# Altium footprint library PCBKU.PcbLib: 197 footprints (part 12 of 13)
Each footprint in its own frame and in the unit in brackets; x right, y up, seen from the top. Pads: shape width x height; smd on the part's side, far side on the other; paste and mask are expansions set on the pad; w line width, h text height; cw(c..) or ccw(c..) is an arc to the next point about the centre after c.
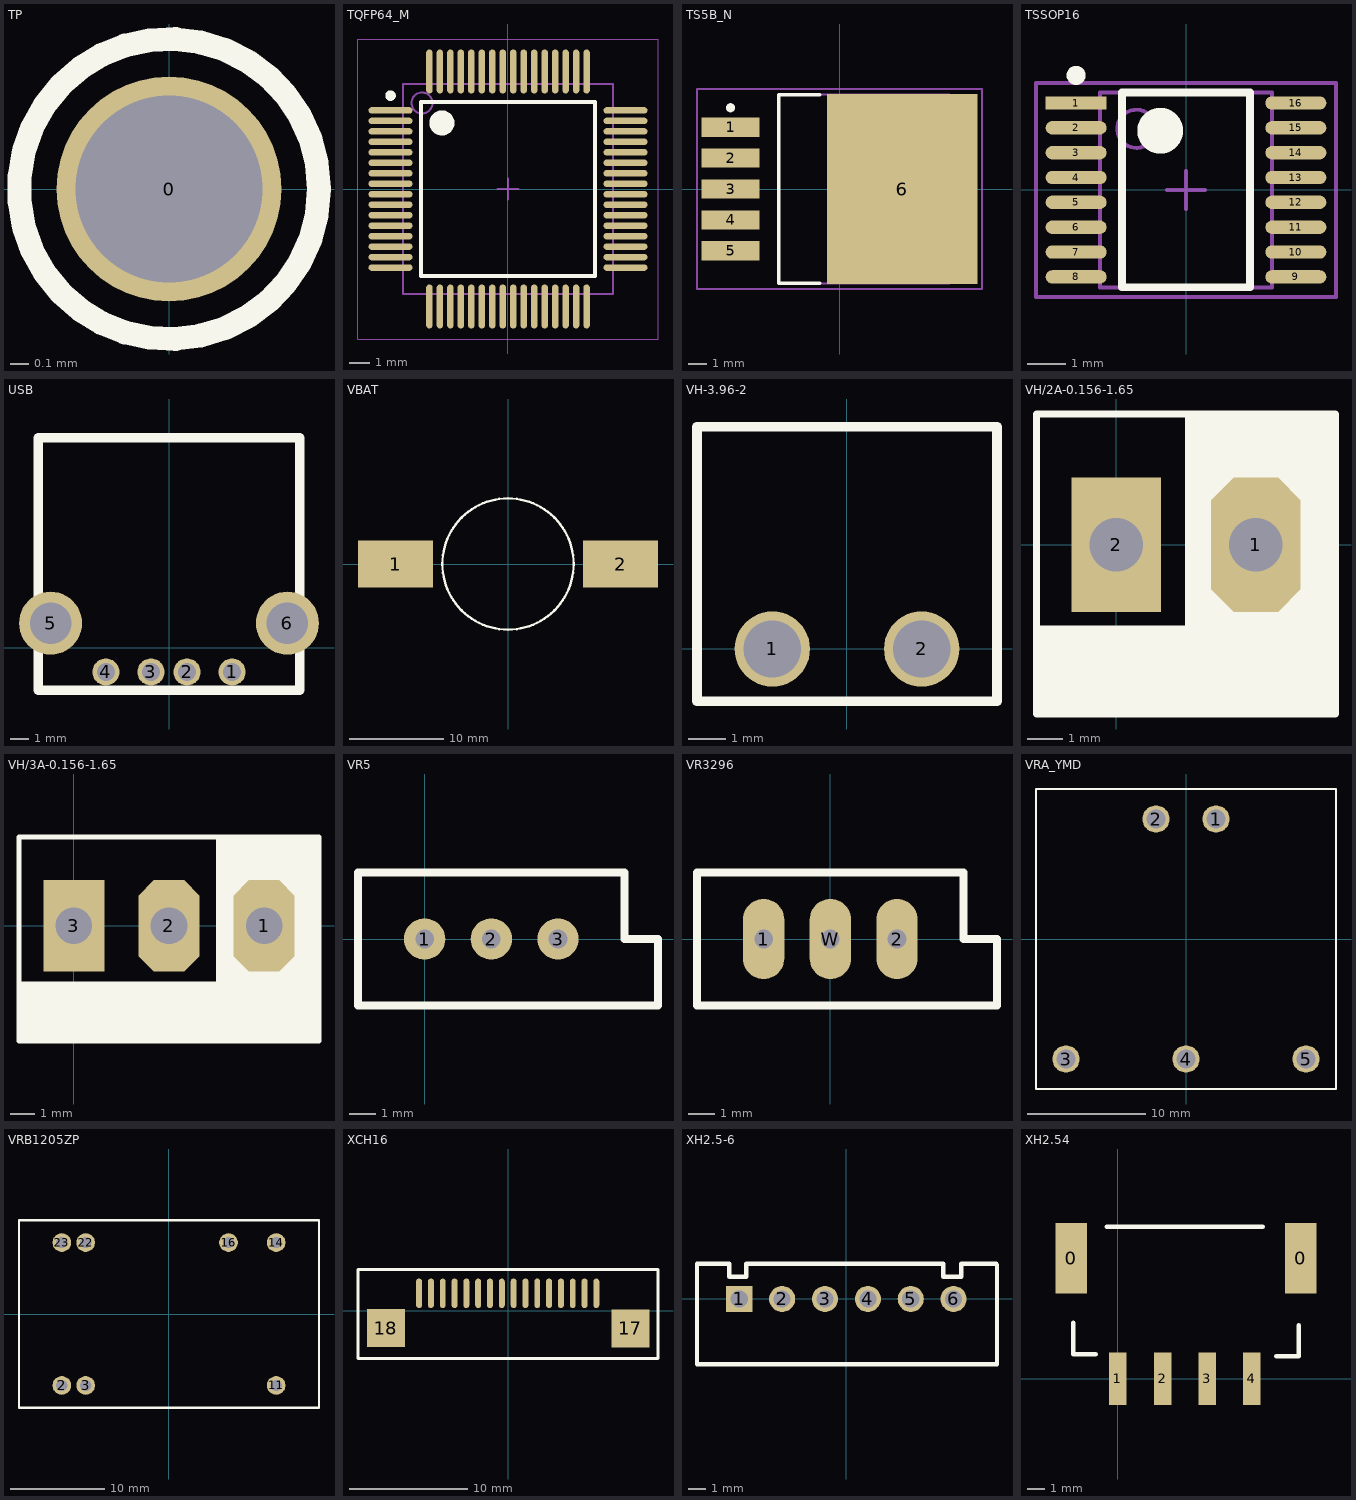
[diagram p11: the footprints below, top view; thin cyan lines are the x and y axes]

## TP [mm]
pads (1):
  round 1.2 hole 1: 0(0,0)
Top Overlay:
  circle w0.127: c0,0 r0.8

## TQFP64_M [mm] "Thin QFP, 64-Leads, Body 10x10mm, Pitch 0.5mm, IPC Low Density"
height 1.6
pads (64):
  oval 2.1x0.3 smd: 1(-5.6,3.75) 2(-5.6,3.25) 3(-5.6,2.75) 4(-5.6,2.25) 5(-5.6,1.75) 6(-5.6,1.25) 7(-5.6,0.75) 8(-5.6,0.25) 9(-5.6,-0.25) 10(-5.6,-0.75) 11(-5.6,-1.25) 12(-5.6,-1.75) 13(-5.6,-2.25) 14(-5.6,-2.75) 15(-5.6,-3.25) 16(-5.6,-3.75) 33(5.6,-3.75) 34(5.6,-3.25) 35(5.6,-2.75) 36(5.6,-2.25) 37(5.6,-1.75) 38(5.6,-1.25) 39(5.6,-0.75) 40(5.6,-0.25) 41(5.6,0.25) 42(5.6,0.75) 43(5.6,1.25) 44(5.6,1.75) 45(5.6,2.25) 46(5.6,2.75) 47(5.6,3.25) 48(5.6,3.75)
  oval 0.3x2.1 smd: 17(-3.75,-5.6) 18(-3.25,-5.6) 19(-2.75,-5.6) 20(-2.25,-5.6) 21(-1.75,-5.6) 22(-1.25,-5.6) 23(-0.75,-5.6) 24(-0.25,-5.6) 25(0.25,-5.6) 26(0.75,-5.6) 27(1.25,-5.6) 28(1.75,-5.6) 29(2.25,-5.6) 30(2.75,-5.6) 31(3.25,-5.6) 32(3.75,-5.6) 49(3.75,5.6) 50(3.25,5.6) 51(2.75,5.6) 52(2.25,5.6) 53(1.75,5.6) 54(1.25,5.6) 55(0.75,5.6) 56(0.25,5.6) 57(-0.25,5.6) 58(-0.75,5.6) 59(-1.25,5.6) 60(-1.75,5.6) 61(-2.25,5.6) 62(-2.75,5.6) 63(-3.25,5.6) 64(-3.75,5.6)
Top Overlay:
  circle w0.25: c-5.6,4.45 r0.125
  circle w0.6: c-3.15,3.15 r0.3
  lines w0.2: -4.15,-4.15 -4.15,4.15 4.15,4.15 4.15,-4.15 -4.15,-4.15
Mechanical 13:
  circle w0.1: c-4.1,4.1 r0.5
  lines w0.1: -5,-5 -5,5 5,5 5,-5 -5,-5
Mechanical 15:
  lines w0.05: -7.15,-7.15 -7.15,7.15 7.15,7.15 7.15,-7.15 -7.15,-7.15
  lines w0.1: -0.5,0 0.5,0 ; 0,-0.5 0,0.5
3D body: height 1.6, standoff 0, extent -5,-5 5,5

## TS5B_N [mm]
pads (6):
  rect 3.2x1.05 smd: 1(-6,3.4) 2(-6,1.7) 3(-6,0) 4(-6,-1.7) 5(-6,-3.4)
  rect 8.3x10.45 smd: 6(3.45,0)
Top Overlay:
  circle w0.25: c-6,4.475 r0.125
  lines w0.2: -1.1,-5.2 -3.35,-5.2 -3.35,5.2 -1.1,5.2
Mechanical 13:
  lines w0.1: -3.35,-5.2 6.05,-5.2 6.05,5.2 -3.35,5.2 -3.35,-5.2
Mechanical 15:
  lines w0.1: -0.5,0 0.5,0 ; 0,-0.5 0,0.5 ; -7.85,-5.5 7.85,-5.5 7.85,5.5 -7.85,5.5 -7.85,-5.5
3D body: height 4.65, standoff 0, extent -3.35,-5.2 6.05,5.2

## TSSOP16 [mm] "TSOP, 16-Leads, Body 5.1x4.5mm (max), Pitch 0.65mm, IPC Medium Density"
height 1.1
pads (16):
  rect 1.6x0.35 smd: 1(-2.875,2.275)
  oval 1.6x0.35 smd: 2(-2.875,1.625) 3(-2.875,0.975) 4(-2.875,0.325) 5(-2.875,-0.325) 6(-2.875,-0.975) 7(-2.875,-1.625) 8(-2.875,-2.275) 9(2.875,-2.275) 10(2.875,-1.625) 11(2.875,-0.975) 12(2.875,-0.325) 13(2.875,0.325) 14(2.875,0.975) 15(2.875,1.625) 16(2.875,2.275)
Top Overlay:
  circle w0.25: c-2.875,3 r0.125
  circle w0.6: c-0.675,1.55 r0.3
  lines w0.2: -1.675,-2.55 -1.675,2.55 1.675,2.55 1.675,-2.55 -1.675,-2.55
Mechanical 13:
  circle w0.1: c-1.3,1.6 r0.5
  lines w0.1: -2.25,-2.55 -2.25,2.55 2.25,2.55 2.25,-2.55 -2.25,-2.55
Mechanical 15:
  lines w0.1: -0.5,0 0.5,0 ; 0,-0.5 0,0.5 ; -3.925,-2.8 -3.925,2.8 3.925,2.8 3.925,-2.8 -3.925,-2.8
3D body: height 1.1, standoff 0.15, extent -2.25,-2.55 2.25,2.55

## USB [mm]
pads (6):
  round 1.5 hole 1: 1(3.5,-1.355) 2(1,-1.355) 3(-1,-1.355) 4(-3.5,-1.355)
  round 3.5 hole 2.3: 5(-6.57,1.355) 6(6.57,1.355)
Top Overlay:
  lines w0.508: -7.25,-2.365 7.25,-2.365 7.25,11.635 -7.25,11.635 -7.25,-2.365

## VBAT [mm]
pads (2):
  rect 8x5 smd: 1(-12,0) 2(12,0)
Top Overlay:
  circle w0.254: c0,0 r7

## VH-3.96-2 [mm]
pads (2):
  round 2 hole 1.524: 1(-1.98,0) 2(1.98,0)
Top Overlay:
  lines w0.254: -3.98,-1.383 3.98,-1.383 3.98,5.893 -3.98,5.893 -3.98,-1.383

## VH/2A-0.156-1.65 [mil]
pads (2):
  oct 100x150 hole 60: 1(155.91,0)
  rect 100x150 hole 60: 2(0,0)
Top Overlay:
  rectangle: 77,-128 242,146
  rectangle: -88,-187 243,-90
  lines w8: 244.95,145 244.95,-189 -89.05,-189 -89.05,146 244.95,146

## VH/3A-0.156-1.65 [mil]
height 43.31
pads (3):
  oct 100x150 hole 60: 1(311.81,0) 2(155.91,0)
  rect 100x150 hole 60: 3(0,0)
Top Overlay:
  rectangle: -88.22,-189.02 401.88,-91.02
  rectangle: 232.97,-117.02 400.97,145.98
  lines w8: -90.16,146 -90.09,-189 401.91,-189 401.97,146 ; -90.09,146 401.91,146

## VR5 [mil]
pads (3):
  round 62 hole 28: 1(0,0) 2(100,0) 3(200,0)
Top Overlay:
  lines w12: -100,-100 -100,100 300,100 300,0 350,0 350,-100 -100,-100

## VR3296 [mil]
pads (3):
  oval 62x120 hole 28: 1(-100,0) 2(100,0) W(0,0)
Top Overlay:
  lines w12: -200,-100 250,-100 250,0 200,0 200,100 -200,100 -200,-100

## VRA_YMD [mm]
pads (5):
  round 2.3 hole 1.6: 1(2.54,10.16) 2(-2.54,10.16) 3(-10.16,-10.16) 4(0,-10.16) 5(10.16,-10.16)
Top Overlay:
  lines w0.203: -12.7,-12.7 -12.7,12.7 12.7,12.7 12.7,-12.7 -12.7,-12.7

## VRB1205ZP [mm]
height 1.1
pads (7):
  round 2 hole 1.2: 2(-11.43,-7.62) 3(-8.89,-7.62) 11(11.43,-7.62) 14(11.43,7.62) 16(6.35,7.62) 22(-8.89,7.62) 23(-11.43,7.62)
Top Overlay:
  lines w0.254: -16,-10 -16,10 16,10 16,-10 -16,-10
3D body: height 10.8, standoff -4.1, extent -16.154,-10.058 15.846,9.942

## XCH16 [mm]
pads (18):
  oval 0.5x2.5 smd: 1(7.458,1.483) 2(6.458,1.483) 3(5.458,1.483) 4(4.458,1.483) 5(3.458,1.483) 6(2.458,1.486) 7(1.458,1.483) 8(0.458,1.483) 9(-0.542,1.483) 10(-1.542,1.483) 11(-2.542,1.483) 12(-3.542,1.483) 13(-4.542,1.483) 14(-5.542,1.483) 15(-6.542,1.483) 16(-7.542,1.483)
  rect 3.2x3.2 smd: 17(10.344,-1.486) 18(-10.344,-1.46)
Top Overlay:
  lines w0.254: -12.712,-4.026 -12.712,3.492 12.676,3.492 12.676,-4.026 -12.712,-4.026

## XH2.5-6 [mm]
pads (6):
  rect 1.524x1.524 hole 1: 1(-6.25,0)
  round 1.524 hole 1: 2(-3.75,0) 3(-1.25,0) 4(1.25,0) 5(3.75,0) 6(6.25,0)
Top Overlay:
  lines w0.254: -5.851,2.042 -5.851,1.295 -6.842,1.295 -6.842,2.042 -8.718,2.042 -8.718,-3.8 8.782,-3.8 8.782,2 ; -5.826,2.042 5.655,2.042 5.655,1.295 6.696,1.295 6.696,2.042 ; 6.722,2.042 8.74,2.042

## XH2.54 [mm]
pads (6):
  rect 1.8x4 smd: 0(-2.667,6.858) 0(10.414,6.858)
  rect 1x3 smd: 1(0,0) 2(2.54,0) 3(5.08,0) 4(7.62,0)
Top Overlay:
  lines w0.254: -2.54,3.175 -2.54,1.397 -1.27,1.397 ; -0.635,8.636 8.255,8.636 ; 9.017,1.27 10.287,1.27 10.287,3.048